# Altium footprint library Connector_Samtec_HLE_SMD.PcbLib: 290 footprints (part 10 of 24)
Each footprint in its own frame and in the unit in brackets; x right, y up, seen from the top. Pads: shape width x height; smd on the part's side, far side on the other; paste and mask are expansions set on the pad; w line width, h text height; cw(c..) or ccw(c..) is an arc to the next point about the centre after c.
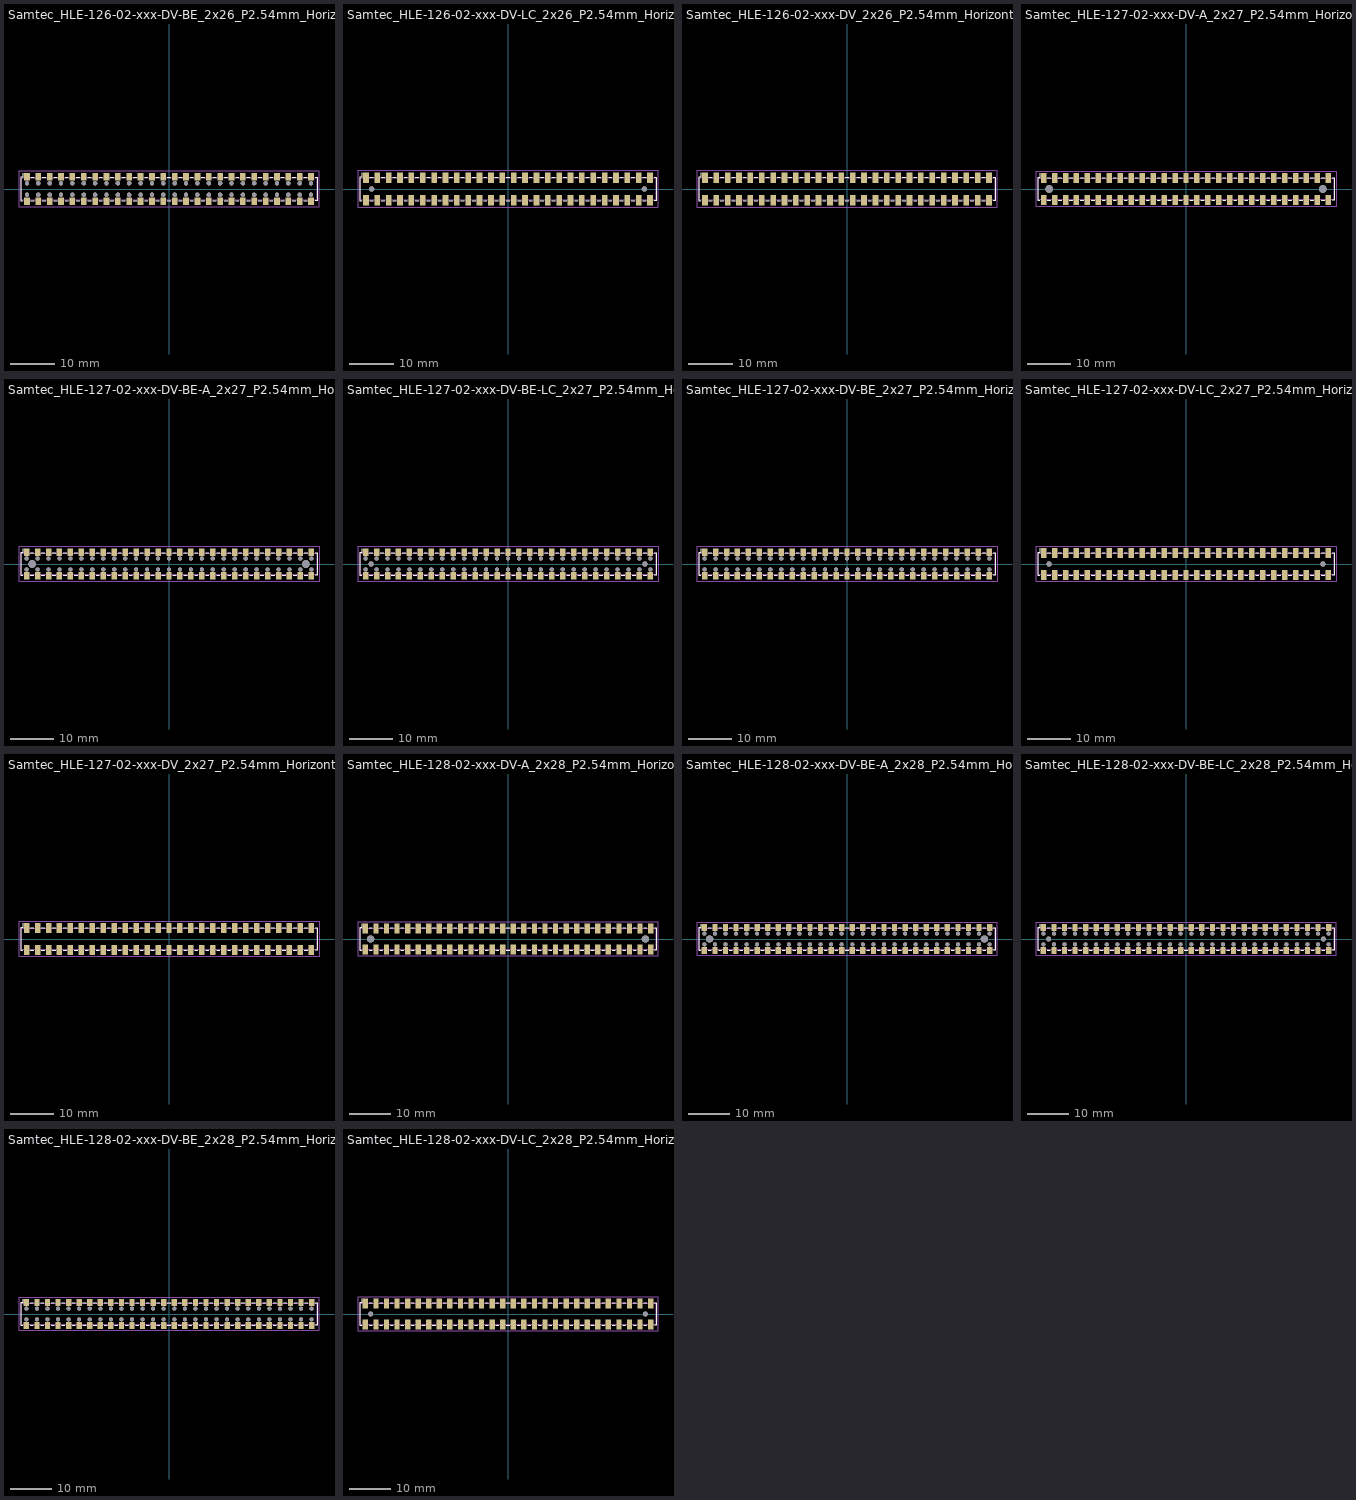
[diagram p9: the footprints below, top view; thin cyan lines are the x and y axes]

## Samtec_HLE-126-02-xxx-DV-BE_2x26_P2.54mm_Horizontal [mm]
pads (104):
  rect 1.27x1.68 smd: 1(-31.75,2.72) 2(-31.75,-2.72) 3(-29.21,2.72) 4(-29.21,-2.72) 5(-26.67,2.72) 6(-26.67,-2.72) 7(-24.13,2.72) 8(-24.13,-2.72) 9(-21.59,2.72) 10(-21.59,-2.72) 11(-19.05,2.72) 12(-19.05,-2.72) 13(-16.51,2.72) 14(-16.51,-2.72) 15(-13.97,2.72) 16(-13.97,-2.72) 17(-11.43,2.72) 18(-11.43,-2.72) 19(-8.89,2.72) 20(-8.89,-2.72) 21(-6.35,2.72) 22(-6.35,-2.72) 23(-3.81,2.72) 24(-3.81,-2.72) 25(-1.27,2.72) 26(-1.27,-2.72) 27(1.27,2.72) 28(1.27,-2.72) 29(3.81,2.72) 30(3.81,-2.72) 31(6.35,2.72) 32(6.35,-2.72) 33(8.89,2.72) 34(8.89,-2.72) 35(11.43,2.72) 36(11.43,-2.72) 37(13.97,2.72) 38(13.97,-2.72) 39(16.51,2.72) 40(16.51,-2.72) 41(19.05,2.72) 42(19.05,-2.72) 43(21.59,2.72) 44(21.59,-2.72) 45(24.13,2.72) 46(24.13,-2.72) 47(26.67,2.72) 48(26.67,-2.72) 49(29.21,2.72) 50(29.21,-2.72) 51(31.75,2.72) 52(31.75,-2.72)
  round 0.97 hole 0.97: Un1(-6.35,1.27) Un2(-16.51,1.27) Un3(24.13,1.27) Un4(8.89,-1.27) Un5(-24.13,-1.27) Un6(6.35,1.27) Un7(3.81,-1.27) Un8(13.97,-1.27) Un9(-31.75,1.27) Un10(21.59,1.27) Un11(-11.43,1.27) Un12(1.27,1.27) Un13(26.67,1.27) Un14(13.97,1.27) Un15(11.43,-1.27) Un16(11.43,1.27) Un17(-3.81,1.27) Un18(-13.97,-1.27) Un19(-6.35,-1.27) Un20(-8.89,1.27) Un21(-29.21,-1.27) Un22(-16.51,-1.27) Un23(31.75,1.27) Un24(31.75,-1.27) Un25(1.27,-1.27) Un26(-24.13,1.27) Un27(-29.21,1.27) Un28(16.51,1.27) Un29(19.05,-1.27) Un30(-8.89,-1.27) Un31(-21.59,1.27) Un32(16.51,-1.27) Un33(-21.59,-1.27) Un34(19.05,1.27) Un35(29.21,1.27) Un36(24.13,-1.27) Un37(-1.27,1.27) Un38(-13.97,1.27) Un39(8.89,1.27) Un40(-26.67,-1.27) Un41(26.67,-1.27) Un42(-19.05,-1.27) Un43(21.59,-1.27) Un44(-1.27,-1.27) Un45(-26.67,1.27) Un46(3.81,1.27) Un47(-11.43,-1.27) Un48(-31.75,-1.27) Un49(-19.05,1.27) Un50(-3.81,-1.27) Un51(29.21,-1.27) Un52(6.35,-1.27)
F.SilkS:
  lines w0.12: -32.645,-2.65 -33.13,-2.65 -33.13,2.65 -32.645,2.65 -32.645,3.56 ; -30.855,-2.65 -30.105,-2.65 ; -30.855,2.65 -30.105,2.65 ; -28.315,-2.65 -27.565,-2.65 ; -28.315,2.65 -27.565,2.65 ; -25.775,-2.65 -25.025,-2.65 ; -25.775,2.65 -25.025,2.65 ; -23.235,-2.65 -22.485,-2.65 ; -23.235,2.65 -22.485,2.65 ; -20.695,-2.65 -19.945,-2.65 ; -20.695,2.65 -19.945,2.65 ; -18.155,-2.65 -17.405,-2.65 ; -18.155,2.65 -17.405,2.65 ; -15.615,-2.65 -14.865,-2.65 ; -15.615,2.65 -14.865,2.65 ; -13.075,-2.65 -12.325,-2.65 ; -13.075,2.65 -12.325,2.65 ; -10.535,-2.65 -9.785,-2.65 ; -10.535,2.65 -9.785,2.65 ; -7.995,-2.65 -7.245,-2.65 ; -7.995,2.65 -7.245,2.65 ; -5.455,-2.65 -4.705,-2.65 ; -5.455,2.65 -4.705,2.65 ; -2.915,-2.65 -2.165,-2.65 ; -2.915,2.65 -2.165,2.65 ; -0.375,-2.65 0.375,-2.65 ; -0.375,2.65 0.375,2.65 ; 2.165,-2.65 2.915,-2.65 ; 2.165,2.65 2.915,2.65 ; 4.705,-2.65 5.455,-2.65 ; 4.705,2.65 5.455,2.65 ; 7.245,-2.65 7.995,-2.65 ; 7.245,2.65 7.995,2.65 ; 9.785,-2.65 10.535,-2.65 ; 9.785,2.65 10.535,2.65 ; 12.325,-2.65 13.075,-2.65 ; 12.325,2.65 13.075,2.65 ; 14.865,-2.65 15.615,-2.65 ; 14.865,2.65 15.615,2.65 ; 17.405,-2.65 18.155,-2.65 ; 17.405,2.65 18.155,2.65 ; 19.945,-2.65 20.695,-2.65 ; 19.945,2.65 20.695,2.65 ; 22.485,-2.65 23.235,-2.65 ; 22.485,2.65 23.235,2.65 ; 25.025,-2.65 25.775,-2.65 ; 25.025,2.65 25.775,2.65 ; 27.565,-2.65 28.315,-2.65 ; 27.565,2.65 28.315,2.65 ; 30.105,-2.65 30.855,-2.65 ; 30.105,2.65 30.855,2.65 ; 32.645,-2.65 33.13,-2.65 33.13,2.65 32.645,2.65
F.CrtYd:
  lines w0.05: -33.52,-4.06 33.52,-4.06 33.52,4.06 -33.52,4.06 -33.52,-4.06
F.Fab:
  lines w0.1: -32.25,2.54 -31.75,1.833 -31.25,2.54 ; -33.02,-2.54 33.02,-2.54 33.02,2.54 -33.02,2.54 -33.02,-2.54
  text "'.Designator'" at -4.047,-2.68 h1

## Samtec_HLE-126-02-xxx-DV-LC_2x26_P2.54mm_Horizontal [mm]
pads (54):
  rect 1.27x2.29 smd: 1(-31.75,2.525) 2(-31.75,-2.525) 3(-29.21,2.525) 4(-29.21,-2.525) 5(-26.67,2.525) 6(-26.67,-2.525) 7(-24.13,2.525) 8(-24.13,-2.525) 9(-21.59,2.525) 10(-21.59,-2.525) 11(-19.05,2.525) 12(-19.05,-2.525) 13(-16.51,2.525) 14(-16.51,-2.525) 15(-13.97,2.525) 16(-13.97,-2.525) 17(-11.43,2.525) 18(-11.43,-2.525) 19(-8.89,2.525) 20(-8.89,-2.525) 21(-6.35,2.525) 22(-6.35,-2.525) 23(-3.81,2.525) 24(-3.81,-2.525) 25(-1.27,2.525) 26(-1.27,-2.525) 27(1.27,2.525) 28(1.27,-2.525) 29(3.81,2.525) 30(3.81,-2.525) 31(6.35,2.525) 32(6.35,-2.525) 33(8.89,2.525) 34(8.89,-2.525) 35(11.43,2.525) 36(11.43,-2.525) 37(13.97,2.525) 38(13.97,-2.525) 39(16.51,2.525) 40(16.51,-2.525) 41(19.05,2.525) 42(19.05,-2.525) 43(21.59,2.525) 44(21.59,-2.525) 45(24.13,2.525) 46(24.13,-2.525) 47(26.67,2.525) 48(26.67,-2.525) 49(29.21,2.525) 50(29.21,-2.525) 51(31.75,2.525) 52(31.75,-2.525)
  round 1.19 hole 1.19: Un1(-30.48,0) Un2(30.48,0)
F.SilkS:
  lines w0.12: -32.645,-2.65 -33.13,-2.65 -33.13,2.65 -32.645,2.65 -32.645,3.67 ; -30.855,-2.65 -30.105,-2.65 ; -30.855,2.65 -30.105,2.65 ; -28.315,-2.65 -27.565,-2.65 ; -28.315,2.65 -27.565,2.65 ; -25.775,-2.65 -25.025,-2.65 ; -25.775,2.65 -25.025,2.65 ; -23.235,-2.65 -22.485,-2.65 ; -23.235,2.65 -22.485,2.65 ; -20.695,-2.65 -19.945,-2.65 ; -20.695,2.65 -19.945,2.65 ; -18.155,-2.65 -17.405,-2.65 ; -18.155,2.65 -17.405,2.65 ; -15.615,-2.65 -14.865,-2.65 ; -15.615,2.65 -14.865,2.65 ; -13.075,-2.65 -12.325,-2.65 ; -13.075,2.65 -12.325,2.65 ; -10.535,-2.65 -9.785,-2.65 ; -10.535,2.65 -9.785,2.65 ; -7.995,-2.65 -7.245,-2.65 ; -7.995,2.65 -7.245,2.65 ; -5.455,-2.65 -4.705,-2.65 ; -5.455,2.65 -4.705,2.65 ; -2.915,-2.65 -2.165,-2.65 ; -2.915,2.65 -2.165,2.65 ; -0.375,-2.65 0.375,-2.65 ; -0.375,2.65 0.375,2.65 ; 2.165,-2.65 2.915,-2.65 ; 2.165,2.65 2.915,2.65 ; 4.705,-2.65 5.455,-2.65 ; 4.705,2.65 5.455,2.65 ; 7.245,-2.65 7.995,-2.65 ; 7.245,2.65 7.995,2.65 ; 9.785,-2.65 10.535,-2.65 ; 9.785,2.65 10.535,2.65 ; 12.325,-2.65 13.075,-2.65 ; 12.325,2.65 13.075,2.65 ; 14.865,-2.65 15.615,-2.65 ; 14.865,2.65 15.615,2.65 ; 17.405,-2.65 18.155,-2.65 ; 17.405,2.65 18.155,2.65 ; 19.945,-2.65 20.695,-2.65 ; 19.945,2.65 20.695,2.65 ; 22.485,-2.65 23.235,-2.65 ; 22.485,2.65 23.235,2.65 ; 25.025,-2.65 25.775,-2.65 ; 25.025,2.65 25.775,2.65 ; 27.565,-2.65 28.315,-2.65 ; 27.565,2.65 28.315,2.65 ; 30.105,-2.65 30.855,-2.65 ; 30.105,2.65 30.855,2.65 ; 32.645,-2.65 33.13,-2.65 33.13,2.65 32.645,2.65
F.CrtYd:
  lines w0.05: -33.52,-4.17 33.52,-4.17 33.52,4.17 -33.52,4.17 -33.52,-4.17
F.Fab:
  lines w0.1: -32.25,2.54 -31.75,1.833 -31.25,2.54 ; -33.02,-2.54 -33.02,2.54 33.02,2.54 33.02,-2.54 -33.02,-2.54
  text "'.Designator'" at -4.047,-2.68 h1

## Samtec_HLE-126-02-xxx-DV_2x26_P2.54mm_Horizontal [mm]
pads (52):
  rect 1.27x2.29 smd: 1(-31.75,2.525) 2(-31.75,-2.525) 3(-29.21,2.525) 4(-29.21,-2.525) 5(-26.67,2.525) 6(-26.67,-2.525) 7(-24.13,2.525) 8(-24.13,-2.525) 9(-21.59,2.525) 10(-21.59,-2.525) 11(-19.05,2.525) 12(-19.05,-2.525) 13(-16.51,2.525) 14(-16.51,-2.525) 15(-13.97,2.525) 16(-13.97,-2.525) 17(-11.43,2.525) 18(-11.43,-2.525) 19(-8.89,2.525) 20(-8.89,-2.525) 21(-6.35,2.525) 22(-6.35,-2.525) 23(-3.81,2.525) 24(-3.81,-2.525) 25(-1.27,2.525) 26(-1.27,-2.525) 27(1.27,2.525) 28(1.27,-2.525) 29(3.81,2.525) 30(3.81,-2.525) 31(6.35,2.525) 32(6.35,-2.525) 33(8.89,2.525) 34(8.89,-2.525) 35(11.43,2.525) 36(11.43,-2.525) 37(13.97,2.525) 38(13.97,-2.525) 39(16.51,2.525) 40(16.51,-2.525) 41(19.05,2.525) 42(19.05,-2.525) 43(21.59,2.525) 44(21.59,-2.525) 45(24.13,2.525) 46(24.13,-2.525) 47(26.67,2.525) 48(26.67,-2.525) 49(29.21,2.525) 50(29.21,-2.525) 51(31.75,2.525) 52(31.75,-2.525)
F.SilkS:
  lines w0.12: -32.645,-2.65 -33.13,-2.65 -33.13,2.65 -32.645,2.65 -32.645,3.67 ; -30.855,-2.65 -30.105,-2.65 ; -30.855,2.65 -30.105,2.65 ; -28.315,-2.65 -27.565,-2.65 ; -28.315,2.65 -27.565,2.65 ; -25.775,-2.65 -25.025,-2.65 ; -25.775,2.65 -25.025,2.65 ; -23.235,-2.65 -22.485,-2.65 ; -23.235,2.65 -22.485,2.65 ; -20.695,-2.65 -19.945,-2.65 ; -20.695,2.65 -19.945,2.65 ; -18.155,-2.65 -17.405,-2.65 ; -18.155,2.65 -17.405,2.65 ; -15.615,-2.65 -14.865,-2.65 ; -15.615,2.65 -14.865,2.65 ; -13.075,-2.65 -12.325,-2.65 ; -13.075,2.65 -12.325,2.65 ; -10.535,-2.65 -9.785,-2.65 ; -10.535,2.65 -9.785,2.65 ; -7.995,-2.65 -7.245,-2.65 ; -7.995,2.65 -7.245,2.65 ; -5.455,-2.65 -4.705,-2.65 ; -5.455,2.65 -4.705,2.65 ; -2.915,-2.65 -2.165,-2.65 ; -2.915,2.65 -2.165,2.65 ; -0.375,-2.65 0.375,-2.65 ; -0.375,2.65 0.375,2.65 ; 2.165,-2.65 2.915,-2.65 ; 2.165,2.65 2.915,2.65 ; 4.705,-2.65 5.455,-2.65 ; 4.705,2.65 5.455,2.65 ; 7.245,-2.65 7.995,-2.65 ; 7.245,2.65 7.995,2.65 ; 9.785,-2.65 10.535,-2.65 ; 9.785,2.65 10.535,2.65 ; 12.325,-2.65 13.075,-2.65 ; 12.325,2.65 13.075,2.65 ; 14.865,-2.65 15.615,-2.65 ; 14.865,2.65 15.615,2.65 ; 17.405,-2.65 18.155,-2.65 ; 17.405,2.65 18.155,2.65 ; 19.945,-2.65 20.695,-2.65 ; 19.945,2.65 20.695,2.65 ; 22.485,-2.65 23.235,-2.65 ; 22.485,2.65 23.235,2.65 ; 25.025,-2.65 25.775,-2.65 ; 25.025,2.65 25.775,2.65 ; 27.565,-2.65 28.315,-2.65 ; 27.565,2.65 28.315,2.65 ; 30.105,-2.65 30.855,-2.65 ; 30.105,2.65 30.855,2.65 ; 32.645,-2.65 33.13,-2.65 33.13,2.65 32.645,2.65
F.CrtYd:
  lines w0.05: -33.52,-4.17 -33.52,4.17 33.52,4.17 33.52,-4.17 -33.52,-4.17
F.Fab:
  lines w0.1: -32.25,2.54 -31.75,1.833 -31.25,2.54 ; -33.02,-2.54 33.02,-2.54 33.02,2.54 -33.02,2.54 -33.02,-2.54
  text "'.Designator'" at -4.047,-2.68 h1

## Samtec_HLE-127-02-xxx-DV-A_2x27_P2.54mm_Horizontal [mm]
pads (56):
  rect 1.27x2.29 smd: 1(-33.02,2.525) 2(-33.02,-2.525) 3(-30.48,2.525) 4(-30.48,-2.525) 5(-27.94,2.525) 6(-27.94,-2.525) 7(-25.4,2.525) 8(-25.4,-2.525) 9(-22.86,2.525) 10(-22.86,-2.525) 11(-20.32,2.525) 12(-20.32,-2.525) 13(-17.78,2.525) 14(-17.78,-2.525) 15(-15.24,2.525) 16(-15.24,-2.525) 17(-12.7,2.525) 18(-12.7,-2.525) 19(-10.16,2.525) 20(-10.16,-2.525) 21(-7.62,2.525) 22(-7.62,-2.525) 23(-5.08,2.525) 24(-5.08,-2.525) 25(-2.54,2.525) 26(-2.54,-2.525) 27(0,2.525) 28(0,-2.525) 29(2.54,2.525) 30(2.54,-2.525) 31(5.08,2.525) 32(5.08,-2.525) 33(7.62,2.525) 34(7.62,-2.525) 35(10.16,2.525) 36(10.16,-2.525) 37(12.7,2.525) 38(12.7,-2.525) 39(15.24,2.525) 40(15.24,-2.525) 41(17.78,2.525) 42(17.78,-2.525) 43(20.32,2.525) 44(20.32,-2.525) 45(22.86,2.525) 46(22.86,-2.525) 47(25.4,2.525) 48(25.4,-2.525) 49(27.94,2.525) 50(27.94,-2.525) 51(30.48,2.525) 52(30.48,-2.525) 53(33.02,2.525) 54(33.02,-2.525)
  round 1.78 hole 1.78: Un1(-31.75,0) Un2(31.75,0)
F.SilkS:
  lines w0.12: -33.915,-2.65 -34.4,-2.65 -34.4,2.65 -33.915,2.65 -33.915,3.67 ; -32.125,-2.65 -31.375,-2.65 ; -32.125,2.65 -31.375,2.65 ; -29.585,-2.65 -28.835,-2.65 ; -29.585,2.65 -28.835,2.65 ; -27.045,-2.65 -26.295,-2.65 ; -27.045,2.65 -26.295,2.65 ; -24.505,-2.65 -23.755,-2.65 ; -24.505,2.65 -23.755,2.65 ; -21.965,-2.65 -21.215,-2.65 ; -21.965,2.65 -21.215,2.65 ; -19.425,-2.65 -18.675,-2.65 ; -19.425,2.65 -18.675,2.65 ; -16.885,-2.65 -16.135,-2.65 ; -16.885,2.65 -16.135,2.65 ; -14.345,-2.65 -13.595,-2.65 ; -14.345,2.65 -13.595,2.65 ; -11.805,-2.65 -11.055,-2.65 ; -11.805,2.65 -11.055,2.65 ; -9.265,-2.65 -8.515,-2.65 ; -9.265,2.65 -8.515,2.65 ; -6.725,-2.65 -5.975,-2.65 ; -6.725,2.65 -5.975,2.65 ; -4.185,-2.65 -3.435,-2.65 ; -4.185,2.65 -3.435,2.65 ; -1.645,-2.65 -0.895,-2.65 ; -1.645,2.65 -0.895,2.65 ; 0.895,-2.65 1.645,-2.65 ; 0.895,2.65 1.645,2.65 ; 3.435,-2.65 4.185,-2.65 ; 3.435,2.65 4.185,2.65 ; 5.975,-2.65 6.725,-2.65 ; 5.975,2.65 6.725,2.65 ; 8.515,-2.65 9.265,-2.65 ; 8.515,2.65 9.265,2.65 ; 11.055,-2.65 11.805,-2.65 ; 11.055,2.65 11.805,2.65 ; 13.595,-2.65 14.345,-2.65 ; 13.595,2.65 14.345,2.65 ; 16.135,-2.65 16.885,-2.65 ; 16.135,2.65 16.885,2.65 ; 18.675,-2.65 19.425,-2.65 ; 18.675,2.65 19.425,2.65 ; 21.215,-2.65 21.965,-2.65 ; 21.215,2.65 21.965,2.65 ; 23.755,-2.65 24.505,-2.65 ; 23.755,2.65 24.505,2.65 ; 26.295,-2.65 27.045,-2.65 ; 26.295,2.65 27.045,2.65 ; 28.835,-2.65 29.585,-2.65 ; 28.835,2.65 29.585,2.65 ; 31.375,-2.65 32.125,-2.65 ; 31.375,2.65 32.125,2.65 ; 33.915,-2.65 34.4,-2.65 34.4,2.65 33.915,2.65
F.CrtYd:
  lines w0.05: -34.79,-4.17 34.79,-4.17 34.79,4.17 -34.79,4.17 -34.79,-4.17
F.Fab:
  lines w0.1: -33.52,2.54 -33.02,1.833 -32.52,2.54 ; -34.29,-2.54 34.29,-2.54 34.29,2.54 -34.29,2.54 -34.29,-2.54
  text "'.Designator'" at -4.047,-2.68 h1

## Samtec_HLE-127-02-xxx-DV-BE-A_2x27_P2.54mm_Horizontal [mm]
pads (110):
  rect 1.27x1.68 smd: 1(-33.02,2.72) 2(-33.02,-2.72) 3(-30.48,2.72) 4(-30.48,-2.72) 5(-27.94,2.72) 6(-27.94,-2.72) 7(-25.4,2.72) 8(-25.4,-2.72) 9(-22.86,2.72) 10(-22.86,-2.72) 11(-20.32,2.72) 12(-20.32,-2.72) 13(-17.78,2.72) 14(-17.78,-2.72) 15(-15.24,2.72) 16(-15.24,-2.72) 17(-12.7,2.72) 18(-12.7,-2.72) 19(-10.16,2.72) 20(-10.16,-2.72) 21(-7.62,2.72) 22(-7.62,-2.72) 23(-5.08,2.72) 24(-5.08,-2.72) 25(-2.54,2.72) 26(-2.54,-2.72) 27(0,2.72) 28(0,-2.72) 29(2.54,2.72) 30(2.54,-2.72) 31(5.08,2.72) 32(5.08,-2.72) 33(7.62,2.72) 34(7.62,-2.72) 35(10.16,2.72) 36(10.16,-2.72) 37(12.7,2.72) 38(12.7,-2.72) 39(15.24,2.72) 40(15.24,-2.72) 41(17.78,2.72) 42(17.78,-2.72) 43(20.32,2.72) 44(20.32,-2.72) 45(22.86,2.72) 46(22.86,-2.72) 47(25.4,2.72) 48(25.4,-2.72) 49(27.94,2.72) 50(27.94,-2.72) 51(30.48,2.72) 52(30.48,-2.72) 53(33.02,2.72) 54(33.02,-2.72)
  round 0.97 hole 0.97: Un1(-12.7,-1.27) Un3(5.08,-1.27) Un4(-33.02,-1.27) Un5(7.62,1.27) Un6(-15.24,1.27) Un7(-30.48,-1.27) Un8(-17.78,1.27) Un9(-33.02,1.27) Un10(27.94,1.27) Un11(22.86,-1.27) Un12(20.32,1.27) Un13(-30.48,1.27) Un14(-12.7,1.27) Un15(25.4,1.27) Un16(-2.54,1.27) Un17(-27.94,1.27) Un18(-22.86,1.27) Un19(-27.94,-1.27) Un20(30.48,-1.27) Un21(5.08,1.27) Un22(-25.4,1.27) Un23(2.54,1.27) Un24(15.24,-1.27) Un25(10.16,-1.27) Un26(-5.08,-1.27) Un27(-20.32,-1.27) Un28(27.94,-1.27) Un29(-7.62,-1.27) Un30(-10.16,1.27) Un31(-20.32,1.27) Un32(17.78,1.27) Un33(-2.54,-1.27) Un34(15.24,1.27) Un35(33.02,-1.27) Un36(0,1.27) Un37(-5.08,1.27) Un38(25.4,-1.27) Un39(7.62,-1.27) Un40(33.02,1.27) Un41(12.7,-1.27) Un42(-22.86,-1.27) Un43(22.86,1.27) Un44(12.7,1.27) Un45(-7.62,1.27) Un46(-17.78,-1.27) Un47(10.16,1.27) Un48(-10.16,-1.27) Un49(-15.24,-1.27) Un50(20.32,-1.27) Un51(-25.4,-1.27) Un53(30.48,1.27) Un54(2.54,-1.27) Un55(17.78,-1.27) Un56(0,-1.27)
  round 1.78 hole 1.78: Un2(31.75,0) Un52(-31.75,0)
F.SilkS:
  lines w0.12: -33.915,-2.65 -34.4,-2.65 -34.4,2.65 -33.915,2.65 -33.915,3.56 ; -32.125,-2.65 -31.375,-2.65 ; -32.125,2.65 -31.375,2.65 ; -29.585,-2.65 -28.835,-2.65 ; -29.585,2.65 -28.835,2.65 ; -27.045,-2.65 -26.295,-2.65 ; -27.045,2.65 -26.295,2.65 ; -24.505,-2.65 -23.755,-2.65 ; -24.505,2.65 -23.755,2.65 ; -21.965,-2.65 -21.215,-2.65 ; -21.965,2.65 -21.215,2.65 ; -19.425,-2.65 -18.675,-2.65 ; -19.425,2.65 -18.675,2.65 ; -16.885,-2.65 -16.135,-2.65 ; -16.885,2.65 -16.135,2.65 ; -14.345,-2.65 -13.595,-2.65 ; -14.345,2.65 -13.595,2.65 ; -11.805,-2.65 -11.055,-2.65 ; -11.805,2.65 -11.055,2.65 ; -9.265,-2.65 -8.515,-2.65 ; -9.265,2.65 -8.515,2.65 ; -6.725,-2.65 -5.975,-2.65 ; -6.725,2.65 -5.975,2.65 ; -4.185,-2.65 -3.435,-2.65 ; -4.185,2.65 -3.435,2.65 ; -1.645,-2.65 -0.895,-2.65 ; -1.645,2.65 -0.895,2.65 ; 0.895,-2.65 1.645,-2.65 ; 0.895,2.65 1.645,2.65 ; 3.435,-2.65 4.185,-2.65 ; 3.435,2.65 4.185,2.65 ; 5.975,-2.65 6.725,-2.65 ; 5.975,2.65 6.725,2.65 ; 8.515,-2.65 9.265,-2.65 ; 8.515,2.65 9.265,2.65 ; 11.055,-2.65 11.805,-2.65 ; 11.055,2.65 11.805,2.65 ; 13.595,-2.65 14.345,-2.65 ; 13.595,2.65 14.345,2.65 ; 16.135,-2.65 16.885,-2.65 ; 16.135,2.65 16.885,2.65 ; 18.675,-2.65 19.425,-2.65 ; 18.675,2.65 19.425,2.65 ; 21.215,-2.65 21.965,-2.65 ; 21.215,2.65 21.965,2.65 ; 23.755,-2.65 24.505,-2.65 ; 23.755,2.65 24.505,2.65 ; 26.295,-2.65 27.045,-2.65 ; 26.295,2.65 27.045,2.65 ; 28.835,-2.65 29.585,-2.65 ; 28.835,2.65 29.585,2.65 ; 31.375,-2.65 32.125,-2.65 ; 31.375,2.65 32.125,2.65 ; 33.915,-2.65 34.4,-2.65 34.4,2.65 33.915,2.65
F.CrtYd:
  lines w0.05: -34.79,-4.06 34.79,-4.06 34.79,4.06 -34.79,4.06 -34.79,-4.06
F.Fab:
  lines w0.1: -33.52,2.54 -33.02,1.833 -32.52,2.54 ; -34.29,-2.54 -34.29,2.54 34.29,2.54 34.29,-2.54 -34.29,-2.54
  text "'.Designator'" at -4.047,-2.68 h1

## Samtec_HLE-127-02-xxx-DV-BE-LC_2x27_P2.54mm_Horizontal [mm]
pads (110):
  rect 1.27x1.68 smd: 1(-33.02,2.72) 2(-33.02,-2.72) 3(-30.48,2.72) 4(-30.48,-2.72) 5(-27.94,2.72) 6(-27.94,-2.72) 7(-25.4,2.72) 8(-25.4,-2.72) 9(-22.86,2.72) 10(-22.86,-2.72) 11(-20.32,2.72) 12(-20.32,-2.72) 13(-17.78,2.72) 14(-17.78,-2.72) 15(-15.24,2.72) 16(-15.24,-2.72) 17(-12.7,2.72) 18(-12.7,-2.72) 19(-10.16,2.72) 20(-10.16,-2.72) 21(-7.62,2.72) 22(-7.62,-2.72) 23(-5.08,2.72) 24(-5.08,-2.72) 25(-2.54,2.72) 26(-2.54,-2.72) 27(0,2.72) 28(0,-2.72) 29(2.54,2.72) 30(2.54,-2.72) 31(5.08,2.72) 32(5.08,-2.72) 33(7.62,2.72) 34(7.62,-2.72) 35(10.16,2.72) 36(10.16,-2.72) 37(12.7,2.72) 38(12.7,-2.72) 39(15.24,2.72) 40(15.24,-2.72) 41(17.78,2.72) 42(17.78,-2.72) 43(20.32,2.72) 44(20.32,-2.72) 45(22.86,2.72) 46(22.86,-2.72) 47(25.4,2.72) 48(25.4,-2.72) 49(27.94,2.72) 50(27.94,-2.72) 51(30.48,2.72) 52(30.48,-2.72) 53(33.02,2.72) 54(33.02,-2.72)
  round 0.97 hole 0.97: Un1(-5.08,-1.27) Un2(27.94,-1.27) Un3(5.08,-1.27) Un4(15.24,-1.27) Un5(2.54,1.27) Un6(25.4,1.27) Un7(20.32,1.27) Un8(-15.24,1.27) Un9(17.78,-1.27) Un10(5.08,1.27) Un11(7.62,1.27) Un12(-27.94,1.27) Un13(7.62,-1.27) Un14(12.7,-1.27) Un15(-10.16,-1.27) Un16(-33.02,1.27) Un17(0,1.27) Un18(-17.78,-1.27) Un19(-7.62,1.27) Un20(-15.24,-1.27) Un21(-22.86,-1.27) Un22(-30.48,1.27) Un23(25.4,-1.27) Un24(10.16,1.27) Un25(-22.86,1.27) Un26(-12.7,1.27) Un27(10.16,-1.27) Un28(-27.94,-1.27) Un30(0,-1.27) Un31(30.48,-1.27) Un32(-10.16,1.27) Un33(-33.02,-1.27) Un34(-30.48,-1.27) Un35(30.48,1.27) Un36(33.02,1.27) Un37(2.54,-1.27) Un38(15.24,1.27) Un39(12.7,1.27) Un40(-20.32,-1.27) Un41(20.32,-1.27) Un42(22.86,-1.27) Un43(-7.62,-1.27) Un44(-2.54,1.27) Un45(-2.54,-1.27) Un46(-12.7,-1.27) Un47(-17.78,1.27) Un48(33.02,-1.27) Un49(27.94,1.27) Un50(17.78,1.27) Un51(-25.4,-1.27) Un52(22.86,1.27) Un53(-25.4,1.27) Un55(-20.32,1.27) Un56(-5.08,1.27)
  round 1.19 hole 1.19: Un29(31.75,0) Un54(-31.75,0)
F.SilkS:
  lines w0.12: -33.915,-2.65 -34.4,-2.65 -34.4,2.65 -33.915,2.65 -33.915,3.56 ; -32.125,-2.65 -31.375,-2.65 ; -32.125,2.65 -31.375,2.65 ; -29.585,-2.65 -28.835,-2.65 ; -29.585,2.65 -28.835,2.65 ; -27.045,-2.65 -26.295,-2.65 ; -27.045,2.65 -26.295,2.65 ; -24.505,-2.65 -23.755,-2.65 ; -24.505,2.65 -23.755,2.65 ; -21.965,-2.65 -21.215,-2.65 ; -21.965,2.65 -21.215,2.65 ; -19.425,-2.65 -18.675,-2.65 ; -19.425,2.65 -18.675,2.65 ; -16.885,-2.65 -16.135,-2.65 ; -16.885,2.65 -16.135,2.65 ; -14.345,-2.65 -13.595,-2.65 ; -14.345,2.65 -13.595,2.65 ; -11.805,-2.65 -11.055,-2.65 ; -11.805,2.65 -11.055,2.65 ; -9.265,-2.65 -8.515,-2.65 ; -9.265,2.65 -8.515,2.65 ; -6.725,-2.65 -5.975,-2.65 ; -6.725,2.65 -5.975,2.65 ; -4.185,-2.65 -3.435,-2.65 ; -4.185,2.65 -3.435,2.65 ; -1.645,-2.65 -0.895,-2.65 ; -1.645,2.65 -0.895,2.65 ; 0.895,-2.65 1.645,-2.65 ; 0.895,2.65 1.645,2.65 ; 3.435,-2.65 4.185,-2.65 ; 3.435,2.65 4.185,2.65 ; 5.975,-2.65 6.725,-2.65 ; 5.975,2.65 6.725,2.65 ; 8.515,-2.65 9.265,-2.65 ; 8.515,2.65 9.265,2.65 ; 11.055,-2.65 11.805,-2.65 ; 11.055,2.65 11.805,2.65 ; 13.595,-2.65 14.345,-2.65 ; 13.595,2.65 14.345,2.65 ; 16.135,-2.65 16.885,-2.65 ; 16.135,2.65 16.885,2.65 ; 18.675,-2.65 19.425,-2.65 ; 18.675,2.65 19.425,2.65 ; 21.215,-2.65 21.965,-2.65 ; 21.215,2.65 21.965,2.65 ; 23.755,-2.65 24.505,-2.65 ; 23.755,2.65 24.505,2.65 ; 26.295,-2.65 27.045,-2.65 ; 26.295,2.65 27.045,2.65 ; 28.835,-2.65 29.585,-2.65 ; 28.835,2.65 29.585,2.65 ; 31.375,-2.65 32.125,-2.65 ; 31.375,2.65 32.125,2.65 ; 33.915,-2.65 34.4,-2.65 34.4,2.65 33.915,2.65
F.CrtYd:
  lines w0.05: -34.79,-4.06 -34.79,4.06 34.79,4.06 34.79,-4.06 -34.79,-4.06
F.Fab:
  lines w0.1: -33.52,2.54 -33.02,1.833 -32.52,2.54 ; -34.29,-2.54 34.29,-2.54 34.29,2.54 -34.29,2.54 -34.29,-2.54
  text "'.Designator'" at -4.047,-2.68 h1
